# Altium footprint library DIP Connector.PcbLib: 66 footprints (part 4 of 5)
Each footprint in its own frame and in the unit in brackets; x right, y up, seen from the top. Pads: shape width x height; smd on the part's side, far side on the other; paste and mask are expansions set on the pad; w line width, h text height; cw(c..) or ccw(c..) is an arc to the next point about the centre after c.
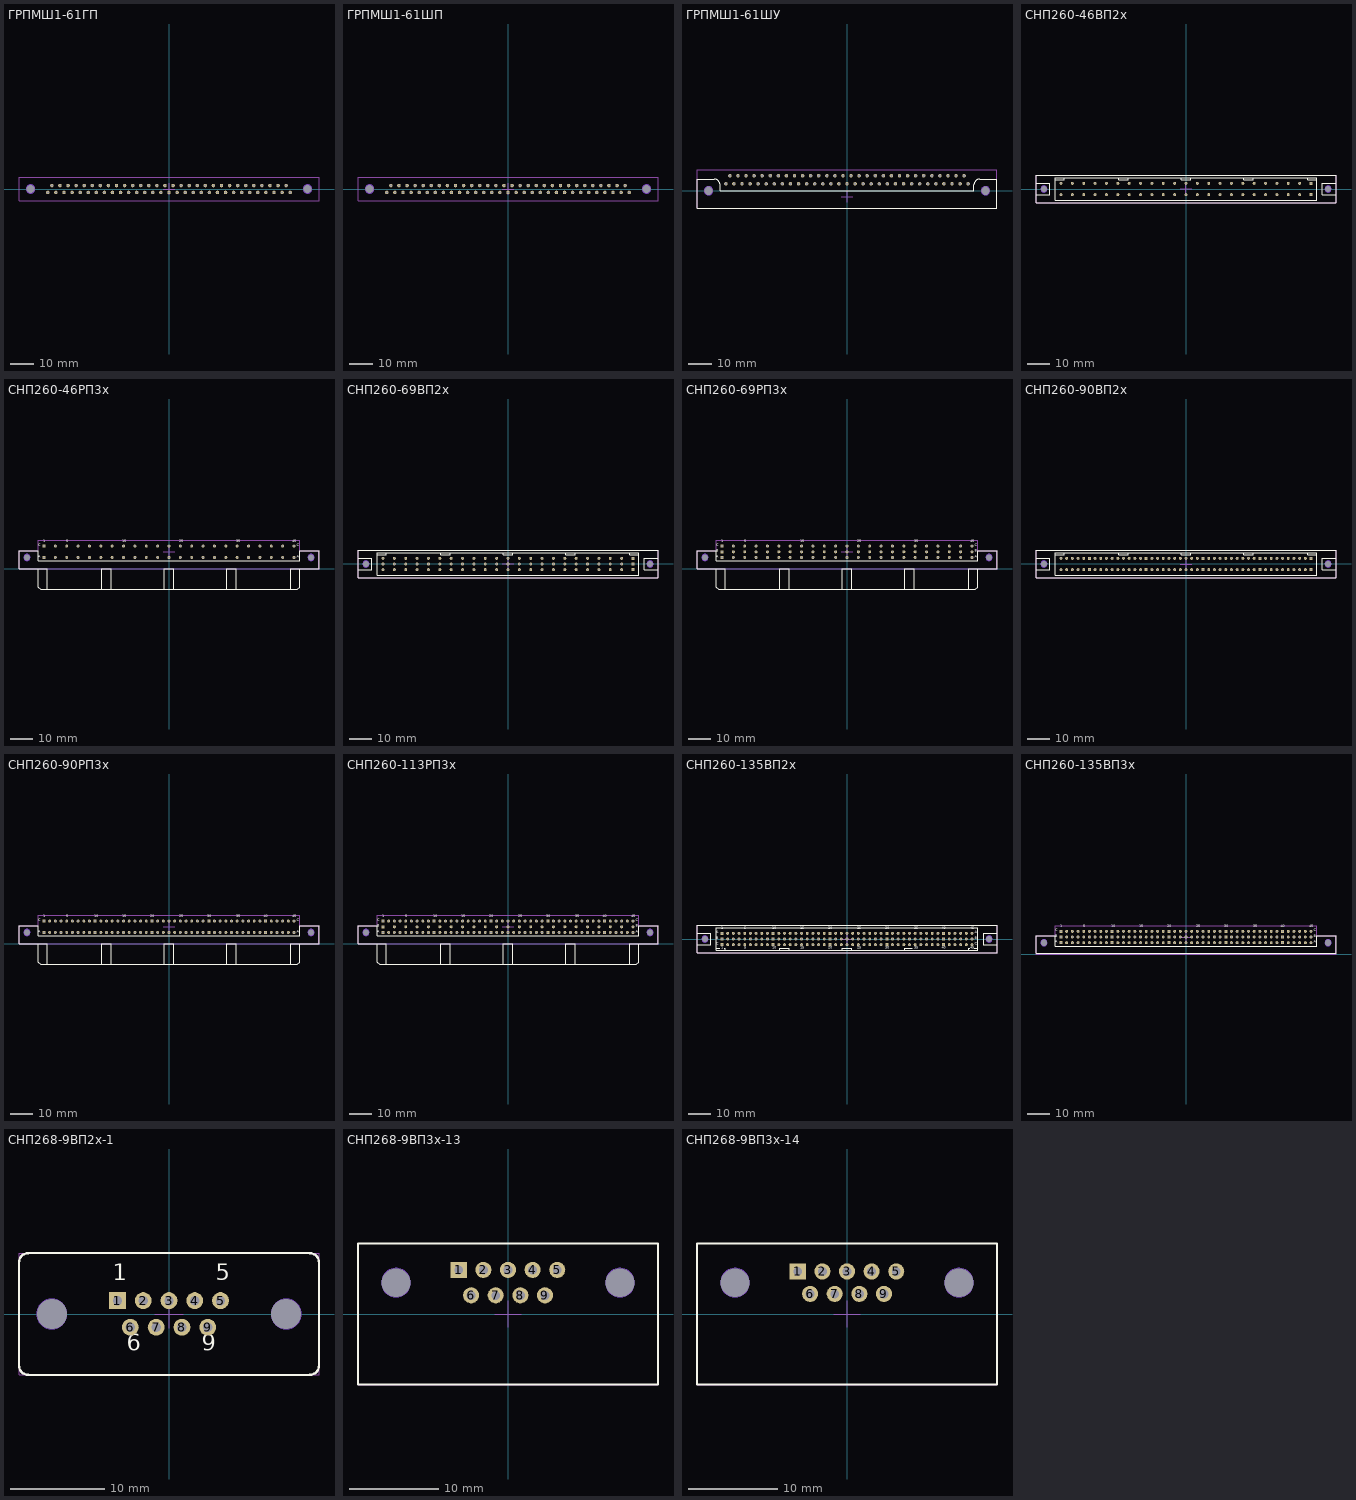
[diagram p3: the footprints below, top view; thin cyan lines are the x and y axes]

## ГРПМШ1-61ГП [mm] "61-контактная розетка для прямого монтажа в отверстие печатной платы"
pads (63):
  round 0.1 hole 3.6 unplated: 0(-60,0) 0(60,0)
  round 1.5 hole 1: А1(-50.75,1.5) А2(-47.25,1.5) А3(-43.75,1.5) А4(-40.25,1.5) А5(-36.75,1.5) А6(-33.25,1.5) А7(-29.75,1.5) А8(-26.25,1.5) А9(-22.75,1.5) А10(-19.25,1.5) А11(-15.75,1.5) А12(-12.25,1.5) А13(-8.75,1.5) А14(-5.25,1.5) А15(-1.75,1.5) А16(1.75,1.5) А17(5.25,1.5) А18(8.75,1.5) А19(12.25,1.5) А20(15.75,1.5) А21(19.25,1.5) А22(22.75,1.5) А23(26.25,1.5) А24(29.75,1.5) А25(33.25,1.5) А26(36.75,1.5) А27(40.25,1.5) А28(43.75,1.5) А29(47.25,1.5) А30(50.75,1.5) Б1(-52.5,-1.5) Б2(-49,-1.5) Б3(-45.5,-1.5) Б4(-42,-1.5) Б5(-38.5,-1.5) Б6(-35,-1.5) Б7(-31.5,-1.5) Б8(-28,-1.5) Б9(-24.5,-1.5) Б10(-21,-1.5) Б11(-17.5,-1.5) Б12(-14,-1.5) Б13(-10.5,-1.5) Б14(-7,-1.5) Б15(-3.5,-1.5) Б16(0,-1.5) Б17(3.5,-1.5) Б18(7,-1.5) Б19(10.5,-1.5) Б20(14,-1.5) Б21(17.5,-1.5) Б22(21,-1.5) Б23(24.5,-1.5) Б24(28,-1.5) Б25(31.5,-1.5) Б26(35,-1.5) Б27(38.5,-1.5) Б28(42,-1.5) Б29(45.5,-1.5) Б30(49,-1.5) Б31(52.5,-1.5)
Top Layer keep-out:
  circle w0.1: c-60,0 r1.8
  circle w0.1: c60,0 r1.8
Bottom Layer keep-out:
  circle w0.1: c-60,0 r1.8
  circle w0.1: c60,0 r1.8
Mechanical 15:
  lines w0.1: -61.25,0 -58.75,0 ; -60,-1.25 -60,1.25 ; -2.5,0 2.5,0 ; 0,-2.5 0,2.5 ; 58.75,0 61.25,0 ; 60,-1.25 60,1.25 ; -65,-5 65,-5 65,5 -65,5 -65,-5

## ГРПМШ1-61ШП [mm] "61-контактная вилка для прямого монтажа в отверстие печатной платы"
pads (63):
  round 0.1 hole 3.6 unplated: 0(-60,0) 0(60,0)
  round 1.5 hole 1: А1(-50.75,1.5) А2(-47.25,1.5) А3(-43.75,1.5) А4(-40.25,1.5) А5(-36.75,1.5) А6(-33.25,1.5) А7(-29.75,1.5) А8(-26.25,1.5) А9(-22.75,1.5) А10(-19.25,1.5) А11(-15.75,1.5) А12(-12.25,1.5) А13(-8.75,1.5) А14(-5.25,1.5) А15(-1.75,1.5) А16(1.75,1.5) А17(5.25,1.5) А18(8.75,1.5) А19(12.25,1.5) А20(15.75,1.5) А21(19.25,1.5) А22(22.75,1.5) А23(26.25,1.5) А24(29.75,1.5) А25(33.25,1.5) А26(36.75,1.5) А27(40.25,1.5) А28(43.75,1.5) А29(47.25,1.5) А30(50.75,1.5) Б1(-52.5,-1.5) Б2(-49,-1.5) Б3(-45.5,-1.5) Б4(-42,-1.5) Б5(-38.5,-1.5) Б6(-35,-1.5) Б7(-31.5,-1.5) Б8(-28,-1.5) Б9(-24.5,-1.5) Б10(-21,-1.5) Б11(-17.5,-1.5) Б12(-14,-1.5) Б13(-10.5,-1.5) Б14(-7,-1.5) Б15(-3.5,-1.5) Б16(0,-1.5) Б17(3.5,-1.5) Б18(7,-1.5) Б19(10.5,-1.5) Б20(14,-1.5) Б21(17.5,-1.5) Б22(21,-1.5) Б23(24.5,-1.5) Б24(28,-1.5) Б25(31.5,-1.5) Б26(35,-1.5) Б27(38.5,-1.5) Б28(42,-1.5) Б29(45.5,-1.5) Б30(49,-1.5) Б31(52.5,-1.5)
Top Layer keep-out:
  circle w0.1: c-60,0 r1.8
  circle w0.1: c60,0 r1.8
Bottom Layer keep-out:
  circle w0.1: c-60,0 r1.8
  circle w0.1: c60,0 r1.8
Mechanical 15:
  lines w0.1: -61.25,0 -58.75,0 ; -60,-1.25 -60,1.25 ; -2.5,0 2.5,0 ; 0,-2.5 0,2.5 ; 58.75,0 61.25,0 ; 60,-1.25 60,1.25 ; -65,-5 65,-5 65,5 -65,5 -65,-5

## ГРПМШ1-61ШУ [mm] "61-контактная вилка для углового монтажа в отверстие печатной платы"
pads (63):
  round 0.1 hole 3.6 unplated: 0(-60,0) 0(60,0)
  round 1.5 hole 1: А1(50.75,6.5) А2(47.25,6.5) А3(43.75,6.5) А4(40.25,6.5) А5(36.75,6.5) А6(33.25,6.5) А7(29.75,6.5) А8(26.25,6.5) А9(22.75,6.5) А10(19.25,6.5) А11(15.75,6.5) А12(12.25,6.5) А13(8.75,6.5) А14(5.25,6.5) А15(1.75,6.5) А16(-1.75,6.5) А17(-5.25,6.5) А18(-8.75,6.5) А19(-12.25,6.5) А20(-15.75,6.5) А21(-19.25,6.5) А22(-22.75,6.5) А23(-26.25,6.5) А24(-29.75,6.5) А25(-33.25,6.5) А26(-36.75,6.5) А27(-40.25,6.5) А28(-43.75,6.5) А29(-47.25,6.5) А30(-50.75,6.5) Б1(52.5,3) Б2(49,3) Б3(45.5,3) Б4(42,3) Б5(38.5,3) Б6(35,3) Б7(31.5,3) Б8(28,3) Б9(24.5,3) Б10(21,3) Б11(17.5,3) Б12(14,3) Б13(10.5,3) Б14(7,3) Б15(3.5,3) Б16(0,3) Б17(-3.5,3) Б18(-7,3) Б19(-10.5,3) Б20(-14,3) Б21(-17.5,3) Б22(-21,3) Б23(-24.5,3) Б24(-28,3) Б25(-31.5,3) Б26(-35,3) Б27(-38.5,3) Б28(-42,3) Б29(-45.5,3) Б30(-49,3) Б31(-52.5,3)
Top Layer keep-out:
  circle w0.1: c60,0 r1.8
  circle w0.1: c-60,0 r1.8
Bottom Layer keep-out:
  circle w0.1: c60,0 r1.8
  circle w0.1: c-60,0 r1.8
Top Overlay:
  lines w0.25: -57.5,5 -65,5 -65,-7.5 65,-7.5 65,5 57.5,5 ; -55,2.5 -55,0 55,0 55,2.5
  lines w0.254: -57.5,5 cw(c-57.5,2.5) -55,2.5 ; 55,2.5 cw(c57.5,2.5) 57.5,5
Mechanical 15:
  lines w0.1: -2.5,-2.5 2.5,-2.5 ; 0,-5 0,0 ; -65,-7.5 65,-7.5 65,9 -65,9 -65,-7.5
3D body: height 5.5, standoff 4.5, extent 32.75,-12.5 33.748,-7.5
3D body: height 5.5, standoff 4.5, extent 32.753,-13 33.747,-12.004
3D body: height 2.5, standoff 1.5, extent 31.003,-13 31.997,-12.004
3D body: height 2.5, standoff 1.5, extent 31,-12.5 31.998,-7.5
3D body: height 5.5, standoff 4.5, extent 36.25,-12.5 37.248,-7.5
3D body: height 5.5, standoff 4.5, extent 36.253,-13 37.247,-12.004
3D body: height 2.5, standoff 1.5, extent 34.503,-13 35.497,-12.004
3D body: height 2.5, standoff 1.5, extent 34.5,-12.5 35.498,-7.5
3D body: height 5.5, standoff 4.5, extent 39.75,-12.5 40.748,-7.5
3D body: height 5.5, standoff 4.5, extent 39.753,-13 40.747,-12.004
3D body: height 2.5, standoff 1.5, extent 38.003,-13 38.997,-12.004
3D body: height 2.5, standoff 1.5, extent 38,-12.5 38.998,-7.5
3D body: height 5.5, standoff 4.5, extent 43.25,-12.5 44.248,-7.5
3D body: height 5.5, standoff 4.5, extent 43.253,-13 44.247,-12.004
3D body: height 2.5, standoff 1.5, extent 41.503,-13 42.497,-12.004
3D body: height 2.5, standoff 1.5, extent 41.5,-12.5 42.498,-7.5
3D body: height 5.5, standoff 4.5, extent 46.75,-12.5 47.748,-7.5
3D body: height 5.5, standoff 4.5, extent 46.753,-13 47.747,-12.004
3D body: height 2.5, standoff 1.5, extent 45.003,-13 45.997,-12.004
3D body: height 2.5, standoff 1.5, extent 45,-12.5 45.998,-7.5
3D body: height 5.5, standoff 4.5, extent 50.25,-12.5 51.248,-7.5
3D body: height 5.5, standoff 4.5, extent 50.253,-13 51.247,-12.004
3D body: height 2.5, standoff 1.5, extent 48.503,-13 49.497,-12.004
3D body: height 2.5, standoff 1.5, extent 48.5,-12.5 49.498,-7.5
3D body: height 2.5, standoff 1.5, extent 52.003,-13 52.997,-12.004
3D body: height 2.5, standoff 1.5, extent 52,-12.5 52.998,-7.5
3D body: height 5.5, standoff 4.5, extent 1.25,-12.5 2.248,-7.5
3D body: height 5.5, standoff 4.5, extent 1.253,-13 2.247,-12.004
3D body: height 2.5, standoff 1.5, extent -0.497,-13 0.497,-12.004
3D body: height 2.5, standoff 1.5, extent -0.5,-12.5 0.498,-7.5
3D body: height 5.5, standoff 4.5, extent 4.75,-12.5 5.748,-7.5
3D body: height 5.5, standoff 4.5, extent 4.753,-13 5.747,-12.004
3D body: height 2.5, standoff 1.5, extent 3.003,-13 3.997,-12.004
3D body: height 2.5, standoff 1.5, extent 3,-12.5 3.998,-7.5
3D body: height 5.5, standoff 4.5, extent 8.25,-12.5 9.248,-7.5
3D body: height 5.5, standoff 4.5, extent 8.253,-13 9.247,-12.004
3D body: height 2.5, standoff 1.5, extent 6.503,-13 7.497,-12.004
3D body: height 2.5, standoff 1.5, extent 6.5,-12.5 7.498,-7.5
3D body: height 5.5, standoff 4.5, extent 11.75,-12.5 12.748,-7.5
3D body: height 5.5, standoff 4.5, extent 11.753,-13 12.747,-12.004
3D body: height 2.5, standoff 1.5, extent 10.003,-13 10.997,-12.004
3D body: height 2.5, standoff 1.5, extent 10,-12.5 10.998,-7.5
3D body: height 5.5, standoff 4.5, extent 15.25,-12.5 16.248,-7.5
3D body: height 5.5, standoff 4.5, extent 15.253,-13 16.247,-12.004
3D body: height 2.5, standoff 1.5, extent 13.503,-13 14.497,-12.004
3D body: height 2.5, standoff 1.5, extent 13.5,-12.5 14.498,-7.5
3D body: height 5.5, standoff 4.5, extent 18.75,-12.5 19.748,-7.5
3D body: height 5.5, standoff 4.5, extent 18.753,-13 19.747,-12.004
3D body: height 2.5, standoff 1.5, extent 17.003,-13 17.997,-12.004
3D body: height 2.5, standoff 1.5, extent 17,-12.5 17.998,-7.5
3D body: height 5.5, standoff 4.5, extent 22.25,-12.5 23.248,-7.5
3D body: height 5.5, standoff 4.5, extent 22.253,-13 23.247,-12.004
3D body: height 2.5, standoff 1.5, extent 20.503,-13 21.497,-12.004
3D body: height 2.5, standoff 1.5, extent 20.5,-12.5 21.498,-7.5
3D body: height 5.5, standoff 4.5, extent 25.75,-12.5 26.748,-7.5
3D body: height 5.5, standoff 4.5, extent 25.753,-13 26.747,-12.004
3D body: height 2.5, standoff 1.5, extent 24.003,-13 24.997,-12.004
3D body: height 2.5, standoff 1.5, extent 24,-12.5 24.998,-7.5
3D body: height 5.5, standoff 4.5, extent 29.25,-12.5 30.248,-7.5
3D body: height 5.5, standoff 4.5, extent 29.253,-13 30.247,-12.004
3D body: height 2.5, standoff 1.5, extent 27.503,-13 28.497,-12.004
3D body: height 2.5, standoff 1.5, extent 27.5,-12.5 28.498,-7.5
3D body: height 2.5, standoff 1.5, extent -4,-12.5 -3.002,-7.5
3D body: height 2.5, standoff 1.5, extent -3.997,-13 -3.003,-12.004
3D body: height 5.5, standoff 4.5, extent -2.247,-13 -1.253,-12.004
3D body: height 5.5, standoff 4.5, extent -2.25,-12.5 -1.252,-7.5
3D body: height 2.5, standoff 1.5, extent -7.5,-12.5 -6.502,-7.5
3D body: height 2.5, standoff 1.5, extent -7.497,-13 -6.503,-12.004
3D body: height 5.5, standoff 4.5, extent -5.747,-13 -4.753,-12.004
3D body: height 5.5, standoff 4.5, extent -5.75,-12.5 -4.752,-7.5
3D body: height 2.5, standoff 1.5, extent -11,-12.5 -10.002,-7.5
3D body: height 2.5, standoff 1.5, extent -10.997,-13 -10.003,-12.004
3D body: height 5.5, standoff 4.5, extent -9.247,-13 -8.253,-12.004
3D body: height 5.5, standoff 4.5, extent -9.25,-12.5 -8.252,-7.5
3D body: height 2.5, standoff 1.5, extent -14.5,-12.5 -13.502,-7.5
3D body: height 2.5, standoff 1.5, extent -14.497,-13 -13.503,-12.004
3D body: height 5.5, standoff 4.5, extent -12.747,-13 -11.753,-12.004
3D body: height 5.5, standoff 4.5, extent -12.75,-12.5 -11.752,-7.5
3D body: height 2.5, standoff 1.5, extent -18,-12.5 -17.002,-7.5
3D body: height 2.5, standoff 1.5, extent -17.997,-13 -17.003,-12.004
3D body: height 5.5, standoff 4.5, extent -16.247,-13 -15.253,-12.004
3D body: height 5.5, standoff 4.5, extent -16.25,-12.5 -15.252,-7.5
3D body: height 2.5, standoff 1.5, extent -21.5,-12.5 -20.502,-7.5
3D body: height 2.5, standoff 1.5, extent -21.497,-13 -20.503,-12.004
3D body: height 5.5, standoff 4.5, extent -19.747,-13 -18.753,-12.004
3D body: height 5.5, standoff 4.5, extent -19.75,-12.5 -18.752,-7.5
3D body: height 2.5, standoff 1.5, extent -25,-12.5 -24.002,-7.5
3D body: height 2.5, standoff 1.5, extent -24.997,-13 -24.003,-12.004
3D body: height 5.5, standoff 4.5, extent -23.247,-13 -22.253,-12.004
3D body: height 5.5, standoff 4.5, extent -23.25,-12.5 -22.252,-7.5
3D body: height 2.5, standoff 1.5, extent -28.5,-12.5 -27.502,-7.5
3D body: height 2.5, standoff 1.5, extent -28.497,-13 -27.503,-12.004
3D body: height 5.5, standoff 4.5, extent -26.747,-13 -25.753,-12.004
3D body: height 5.5, standoff 4.5, extent -26.75,-12.5 -25.752,-7.5
3D body: height 2.5, standoff 1.5, extent -32,-12.5 -31.002,-7.5
3D body: height 2.5, standoff 1.5, extent -31.997,-13 -31.003,-12.004
3D body: height 5.5, standoff 4.5, extent -30.247,-13 -29.253,-12.004
3D body: height 5.5, standoff 4.5, extent -30.25,-12.5 -29.252,-7.5
3D body: height 2.5, standoff 1.5, extent -35.5,-12.5 -34.502,-7.5
3D body: height 2.5, standoff 1.5, extent -35.497,-13 -34.503,-12.004
3D body: height 5.5, standoff 4.5, extent -33.747,-13 -32.753,-12.004
3D body: height 5.5, standoff 4.5, extent -33.75,-12.5 -32.752,-7.5
3D body: height 2.5, standoff 1.5, extent -39,-12.5 -38.002,-7.5
3D body: height 2.5, standoff 1.5, extent -38.997,-13 -38.003,-12.004
3D body: height 5.5, standoff 4.5, extent -37.247,-13 -36.253,-12.004
3D body: height 5.5, standoff 4.5, extent -37.25,-12.5 -36.252,-7.5
3D body: height 2.5, standoff 1.5, extent -42.5,-12.5 -41.502,-7.5
3D body: height 2.5, standoff 1.5, extent -42.497,-13 -41.503,-12.004
3D body: height 5.5, standoff 4.5, extent -40.747,-13 -39.753,-12.004
3D body: height 5.5, standoff 4.5, extent -40.75,-12.5 -39.752,-7.5
3D body: height 2.5, standoff 1.5, extent -46,-12.5 -45.002,-7.5
3D body: height 2.5, standoff 1.5, extent -45.997,-13 -45.003,-12.004
3D body: height 5.5, standoff 4.5, extent -44.247,-13 -43.253,-12.004
3D body: height 5.5, standoff 4.5, extent -44.25,-12.5 -43.252,-7.5
3D body: height 2.5, standoff 1.5, extent -49.5,-12.5 -48.502,-7.5
3D body: height 2.5, standoff 1.5, extent -49.497,-13 -48.503,-12.004
3D body: height 5.5, standoff 4.5, extent -47.747,-13 -46.753,-12.004
3D body: height 5.5, standoff 4.5, extent -47.75,-12.5 -46.752,-7.5
3D body: height 5.5, standoff 4.5, extent -51.25,-12.5 -50.252,-7.5
3D body: height 5.5, standoff 4.5, extent -51.247,-13 -50.253,-12.004
3D body: height 2.5, standoff 1.5, extent -52.997,-13 -52.003,-12.004
3D body: height 2.5, standoff 1.5, extent -53,-12.5 -52.002,-7.5
3D body: height 5, standoff 0, extent 58,-2 62,5
3D body: height 2, standoff -2, extent -52.798,2.701 -52.2,3.299
3D body: height 2.3, standoff 1.7, extent -52.8,2.701 -52.203,3.299
3D body: height 2.3, standoff 1.7, extent -52.799,0 -52.201,3
3D body: height 4.49, standoff 1.5, extent -61.497,-11.5 -58.503,-7.5
3D body: height 4.5, standoff 1.5, extent -61.492,-13 -58.508,-10.013
3D body: height 4, standoff 2, extent 59.005,-13 60.995,-11.009
3D body: height 3.99, standoff 2, extent 59,-12 60.996,-7.5
3D body: height 5, standoff 0, extent -62,-2 -58,5
3D body: height 7, standoff 0, extent -65,-7.5 65,5
3D body: height 5.3, standoff 4.7, extent -51.049,0 -50.451,6.5
3D body: height 5, standoff -2, extent -51.048,6.201 -50.45,6.799
3D body: height 5.3, standoff 4.7, extent -51.05,6.201 -50.453,6.799
3D body: height 5.3, standoff 4.7, extent -47.55,6.201 -46.953,6.799
3D body: height 5, standoff -2, extent -47.548,6.201 -46.95,6.799
3D body: height 5.3, standoff 4.7, extent -47.549,0 -46.951,6.5
3D body: height 2.3, standoff 1.7, extent -49.299,0 -48.701,3
3D body: height 2.3, standoff 1.7, extent -49.3,2.701 -48.703,3.299
3D body: height 2, standoff -2, extent -49.298,2.701 -48.7,3.299
3D body: height 2, standoff -2, extent -45.798,2.701 -45.2,3.299
3D body: height 2.3, standoff 1.7, extent -45.8,2.701 -45.203,3.299
3D body: height 2.3, standoff 1.7, extent -45.799,0 -45.201,3
3D body: height 5.3, standoff 4.7, extent -44.049,0 -43.451,6.5
3D body: height 5, standoff -2, extent -44.048,6.201 -43.45,6.799
3D body: height 5.3, standoff 4.7, extent -44.05,6.201 -43.453,6.799
3D body: height 2, standoff -2, extent -42.298,2.701 -41.7,3.299
3D body: height 2.3, standoff 1.7, extent -42.3,2.701 -41.703,3.299
3D body: height 2.3, standoff 1.7, extent -42.299,0 -41.701,3
3D body: height 5.3, standoff 4.7, extent -40.549,0 -39.951,6.5
3D body: height 5, standoff -2, extent -40.548,6.201 -39.95,6.799
3D body: height 5.3, standoff 4.7, extent -40.55,6.201 -39.953,6.799
3D body: height 2, standoff -2, extent -38.798,2.701 -38.2,3.299
3D body: height 2.3, standoff 1.7, extent -38.8,2.701 -38.203,3.299
3D body: height 2.3, standoff 1.7, extent -38.799,0 -38.201,3
3D body: height 5.3, standoff 4.7, extent -37.049,0 -36.451,6.5
3D body: height 5, standoff -2, extent -37.048,6.201 -36.45,6.799
3D body: height 5.3, standoff 4.7, extent -37.05,6.201 -36.453,6.799
3D body: height 2, standoff -2, extent -35.298,2.701 -34.7,3.299
3D body: height 2.3, standoff 1.7, extent -35.3,2.701 -34.703,3.299
3D body: height 2.3, standoff 1.7, extent -35.299,0 -34.701,3
3D body: height 5.3, standoff 4.7, extent -33.549,0 -32.951,6.5
3D body: height 5, standoff -2, extent -33.548,6.201 -32.95,6.799
3D body: height 5.3, standoff 4.7, extent -33.55,6.201 -32.953,6.799
3D body: height 2, standoff -2, extent -31.798,2.701 -31.2,3.299
3D body: height 2.3, standoff 1.7, extent -31.8,2.701 -31.203,3.299
3D body: height 2.3, standoff 1.7, extent -31.799,0 -31.201,3
3D body: height 5.3, standoff 4.7, extent -30.049,0 -29.451,6.5
3D body: height 5, standoff -2, extent -30.048,6.201 -29.45,6.799
3D body: height 5.3, standoff 4.7, extent -30.05,6.201 -29.453,6.799
3D body: height 2, standoff -2, extent -28.298,2.701 -27.7,3.299
3D body: height 2.3, standoff 1.7, extent -28.3,2.701 -27.703,3.299
3D body: height 2.3, standoff 1.7, extent -28.299,0 -27.701,3
3D body: height 5.3, standoff 4.7, extent -26.549,0 -25.951,6.5
3D body: height 5, standoff -2, extent -26.548,6.201 -25.95,6.799
3D body: height 5.3, standoff 4.7, extent -26.55,6.201 -25.953,6.799
3D body: height 2, standoff -2, extent -24.798,2.701 -24.2,3.299
3D body: height 2.3, standoff 1.7, extent -24.8,2.701 -24.203,3.299
3D body: height 2.3, standoff 1.7, extent -24.799,0 -24.201,3
3D body: height 5.3, standoff 4.7, extent -23.049,0 -22.451,6.5
3D body: height 5, standoff -2, extent -23.048,6.201 -22.45,6.799
3D body: height 5.3, standoff 4.7, extent -23.05,6.201 -22.453,6.799
3D body: height 2, standoff -2, extent -21.298,2.701 -20.7,3.299
3D body: height 2.3, standoff 1.7, extent -21.3,2.701 -20.703,3.299
3D body: height 2.3, standoff 1.7, extent -21.299,0 -20.701,3
3D body: height 5.3, standoff 4.7, extent -19.549,0 -18.951,6.5
3D body: height 5, standoff -2, extent -19.548,6.201 -18.95,6.799
3D body: height 5.3, standoff 4.7, extent -19.55,6.201 -18.953,6.799
3D body: height 2, standoff -2, extent -17.798,2.701 -17.2,3.299
3D body: height 2.3, standoff 1.7, extent -17.8,2.701 -17.203,3.299
3D body: height 2.3, standoff 1.7, extent -17.799,0 -17.201,3
3D body: height 5.3, standoff 4.7, extent -16.049,0 -15.451,6.5
3D body: height 5, standoff -2, extent -16.048,6.201 -15.45,6.799
3D body: height 5.3, standoff 4.7, extent -16.05,6.201 -15.453,6.799
3D body: height 2, standoff -2, extent -14.298,2.701 -13.7,3.299
3D body: height 2.3, standoff 1.7, extent -14.3,2.701 -13.703,3.299
3D body: height 2.3, standoff 1.7, extent -14.299,0 -13.701,3
3D body: height 5.3, standoff 4.7, extent -12.549,0 -11.951,6.5
3D body: height 5, standoff -2, extent -12.548,6.201 -11.95,6.799
3D body: height 5.3, standoff 4.7, extent -12.55,6.201 -11.953,6.799
3D body: height 2, standoff -2, extent -10.798,2.701 -10.2,3.299
3D body: height 2.3, standoff 1.7, extent -10.8,2.701 -10.203,3.299
3D body: height 2.3, standoff 1.7, extent -10.799,0 -10.201,3
3D body: height 5.3, standoff 4.7, extent -9.049,0 -8.451,6.5
3D body: height 5, standoff -2, extent -9.048,6.201 -8.45,6.799
3D body: height 5.3, standoff 4.7, extent -9.05,6.201 -8.453,6.799
3D body: height 2, standoff -2, extent -7.298,2.701 -6.7,3.299
3D body: height 2.3, standoff 1.7, extent -7.3,2.701 -6.703,3.299
3D body: height 2.3, standoff 1.7, extent -7.299,0 -6.701,3
3D body: height 5.3, standoff 4.7, extent -5.549,0 -4.951,6.5
3D body: height 5, standoff -2, extent -5.548,6.201 -4.95,6.799
3D body: height 5.3, standoff 4.7, extent -5.55,6.201 -4.953,6.799
3D body: height 2, standoff -2, extent -3.798,2.701 -3.2,3.299
3D body: height 2.3, standoff 1.7, extent -3.8,2.701 -3.203,3.299
3D body: height 2.3, standoff 1.7, extent -3.799,0 -3.201,3
3D body: height 5.3, standoff 4.7, extent -2.049,0 -1.451,6.5
3D body: height 5, standoff -2, extent -2.048,6.201 -1.45,6.799
3D body: height 5.3, standoff 4.7, extent -2.05,6.201 -1.453,6.799
3D body: height 2, standoff -2, extent -0.298,2.701 0.3,3.299
3D body: height 2.3, standoff 1.7, extent -0.3,2.701 0.297,3.299
3D body: height 2.3, standoff 1.7, extent -0.299,0 0.299,3
3D body: height 5.3, standoff 4.7, extent 1.451,0 2.049,6.5
3D body: height 5, standoff -2, extent 1.452,6.201 2.05,6.799
3D body: height 5.3, standoff 4.7, extent 1.45,6.201 2.047,6.799
3D body: height 2, standoff -2, extent 3.202,2.701 3.8,3.299
3D body: height 2.3, standoff 1.7, extent 3.2,2.701 3.797,3.299
3D body: height 2.3, standoff 1.7, extent 3.201,0 3.799,3
3D body: height 5.3, standoff 4.7, extent 4.951,0 5.549,6.5
3D body: height 5, standoff -2, extent 4.952,6.201 5.55,6.799
3D body: height 5.3, standoff 4.7, extent 4.95,6.201 5.547,6.799
3D body: height 2, standoff -2, extent 6.702,2.701 7.3,3.299
3D body: height 2.3, standoff 1.7, extent 6.7,2.701 7.297,3.299
3D body: height 2.3, standoff 1.7, extent 6.701,0 7.299,3
3D body: height 5.3, standoff 4.7, extent 8.451,0 9.049,6.5
3D body: height 5, standoff -2, extent 8.452,6.201 9.05,6.799
3D body: height 5.3, standoff 4.7, extent 8.45,6.201 9.047,6.799
3D body: height 2, standoff -2, extent 10.202,2.701 10.8,3.299
3D body: height 2.3, standoff 1.7, extent 10.2,2.701 10.797,3.299
3D body: height 2.3, standoff 1.7, extent 10.201,0 10.799,3
3D body: height 5.3, standoff 4.7, extent 11.951,0 12.549,6.5
3D body: height 5, standoff -2, extent 11.952,6.201 12.55,6.799
3D body: height 5.3, standoff 4.7, extent 11.95,6.201 12.547,6.799
3D body: height 2, standoff -2, extent 13.702,2.701 14.3,3.299
3D body: height 2.3, standoff 1.7, extent 13.7,2.701 14.297,3.299
3D body: height 2.3, standoff 1.7, extent 13.701,0 14.299,3
3D body: height 5.3, standoff 4.7, extent 15.451,0 16.049,6.5
3D body: height 5, standoff -2, extent 15.452,6.201 16.05,6.799
3D body: height 5.3, standoff 4.7, extent 15.45,6.201 16.047,6.799
3D body: height 2, standoff -2, extent 17.202,2.701 17.8,3.299
3D body: height 2.3, standoff 1.7, extent 17.2,2.701 17.797,3.299
3D body: height 2.3, standoff 1.7, extent 17.201,0 17.799,3
3D body: height 5.3, standoff 4.7, extent 18.951,0 19.549,6.5
3D body: height 5, standoff -2, extent 18.952,6.201 19.55,6.799
3D body: height 5.3, standoff 4.7, extent 18.95,6.201 19.547,6.799
3D body: height 2, standoff -2, extent 20.702,2.701 21.3,3.299
3D body: height 2.3, standoff 1.7, extent 20.7,2.701 21.297,3.299
3D body: height 2.3, standoff 1.7, extent 20.701,0 21.299,3
3D body: height 5.3, standoff 4.7, extent 22.451,0 23.049,6.5
3D body: height 5, standoff -2, extent 22.452,6.201 23.05,6.799
3D body: height 5.3, standoff 4.7, extent 22.45,6.201 23.047,6.799
3D body: height 2, standoff -2, extent 24.202,2.701 24.8,3.299
3D body: height 2.3, standoff 1.7, extent 24.2,2.701 24.797,3.299
3D body: height 2.3, standoff 1.7, extent 24.201,0 24.799,3
3D body: height 5.3, standoff 4.7, extent 25.951,0 26.549,6.5
3D body: height 5, standoff -2, extent 25.952,6.201 26.55,6.799
3D body: height 5.3, standoff 4.7, extent 25.95,6.201 26.547,6.799
3D body: height 2, standoff -2, extent 27.702,2.701 28.3,3.299
3D body: height 2.3, standoff 1.7, extent 27.7,2.701 28.297,3.299
3D body: height 2.3, standoff 1.7, extent 27.701,0 28.299,3
3D body: height 5.3, standoff 4.7, extent 29.451,0 30.049,6.5